# Altium footprint library 04.连接器件.pcb.PCBLIB: 363 footprints (part 4 of 23)
Each footprint in its own frame and in the unit in brackets; x right, y up, seen from the top. Pads: shape width x height; smd on the part's side, far side on the other; paste and mask are expansions set on the pad; w line width, h text height; cw(c..) or ccw(c..) is an arc to the next point about the centre after c.
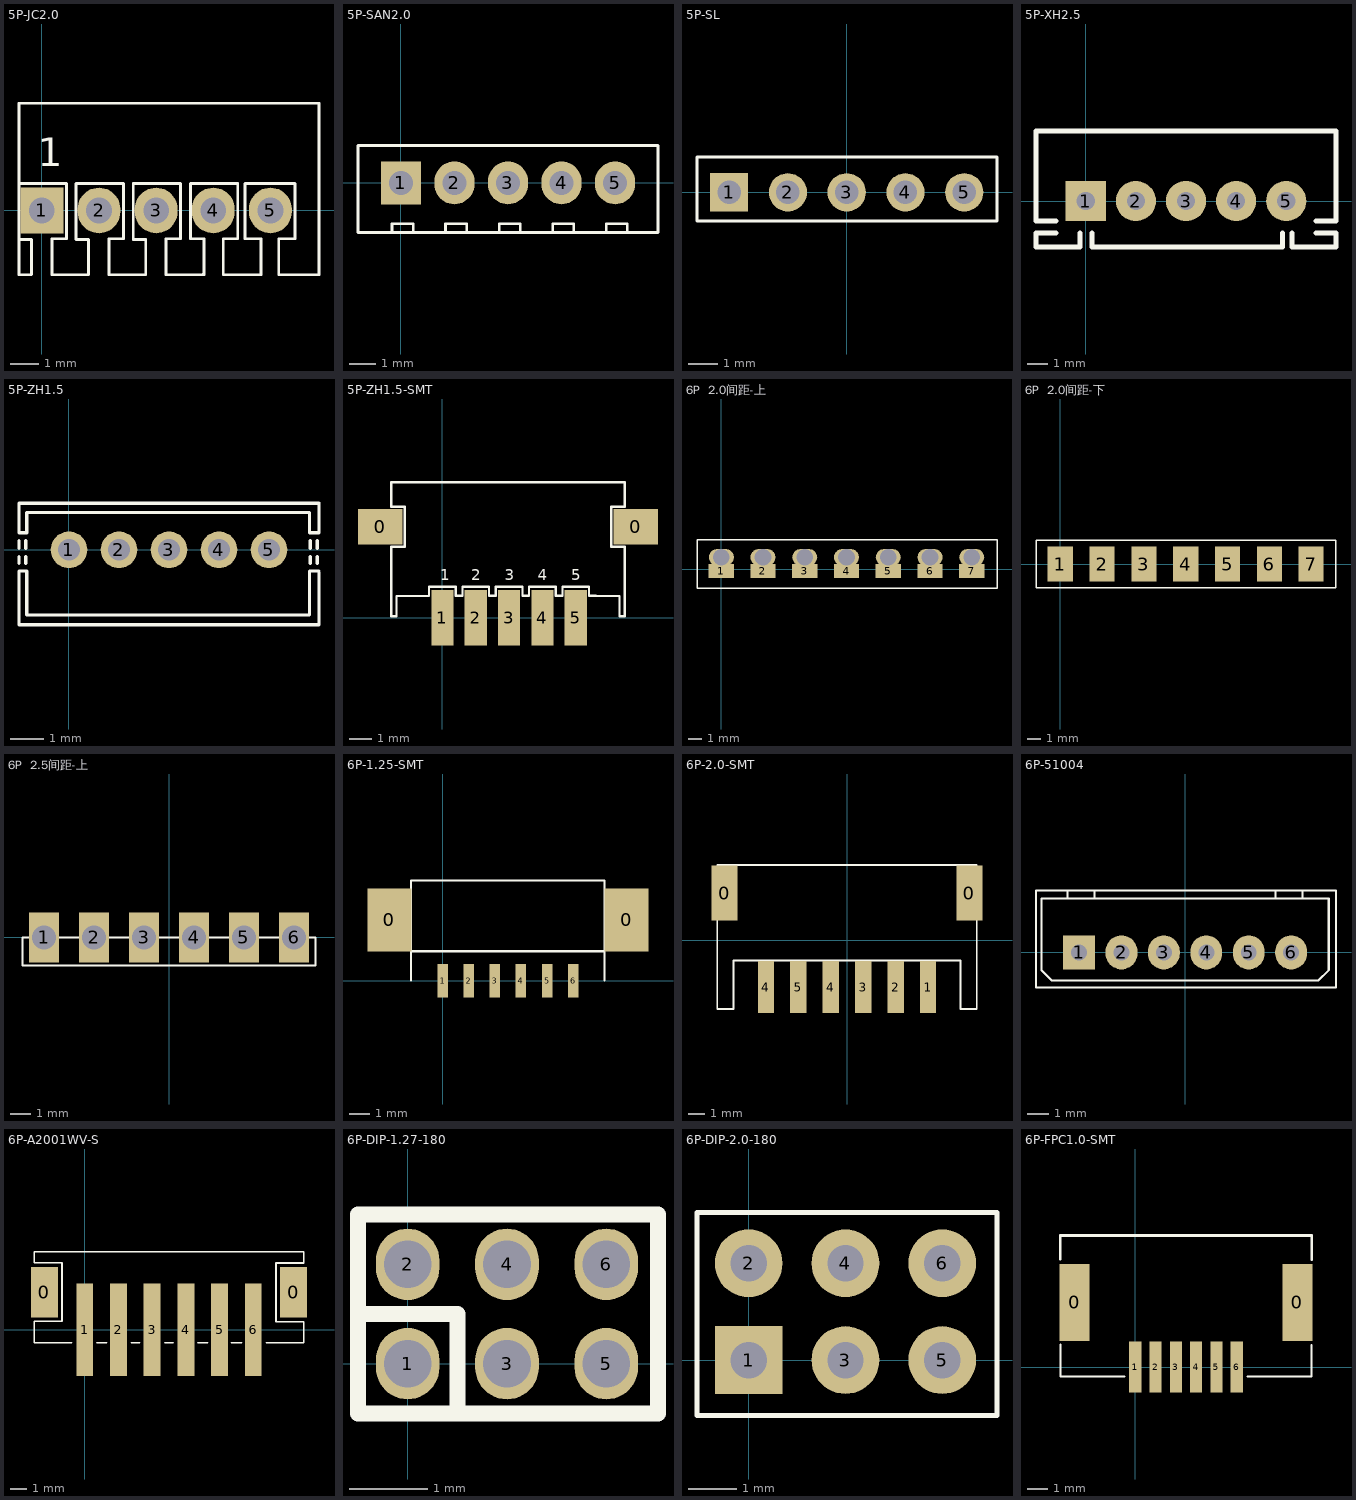
[diagram p3: the footprints below, top view; thin cyan lines are the x and y axes]

## 5P-JC2.0 [mm]
pads (5):
  rect 1.5x1.6 hole 0.9: 1(0,0)
  oval 1.5x1.6 hole 0.9: 2(2,0) 3(4,0) 4(6,0) 5(8,0)
TopOverlay:
  lines w0.1: 5.2,-2.25 5.623,-2.25 5.638,-2.235 ; 8.289,-1.005 8.289,-2.25 9.7,-2.25 9.7,3.75 -0.8,3.75 -0.8,0.94 ; 8.305,-0.991 8.864,-0.991 8.864,0.94 7.111,0.94 7.111,-0.991 7.67,-0.991 7.67,-2.25 6.349,-2.25 6.349,-0.991 6.857,-0.991 6.857,0.94 5.2,0.94 5.2,-0.991 5.67,-0.991 5.67,-2.25 4.349,-2.25 4.349,-0.991 4.857,-0.991 4.857,0.94 3.2,0.94 3.2,-1.016 3.638,-1.016 3.638,-2.235 3.623,-2.25 2.349,-2.25 2.349,-0.991 2.857,-0.991 2.857,0.94 1.2,0.94 1.2,-1.016 1.638,-1.016 1.638,-2.235 1.623,-2.25 1.2,-2.25 0.349,-2.25 0.349,-0.991 0.857,-0.991 0.857,0.94 -0.8,0.94 ; -0.8,-1.016 -0.362,-1.016 -0.362,-2.235 -0.377,-2.25 -0.8,-2.25 -0.8,-1.016 ; -0.8,-1.016 -0.8,0.94
  text "1" at -0.152,1.549 h1
3D body "5P-JC2.0.STEP": height 3.4, standoff -3.22, extent -1.237,-7.19 9.263,3.81

## 5P-SAN2.0 [mm]
pads (5):
  rect 1.5x1.6 hole 0.9: 1(0,0)
  oval 1.5x1.6 hole 0.9: 2(2,0) 3(4,0) 4(6,0) 5(8,0)
TopOverlay:
  lines w0.1: -1.6,-1.85 -1.6,1.4 9.601,1.4 ; -1.575,-1.854 9.601,-1.854 9.601,1.397 ; -0.33,-1.85 -0.33,-1.524 0.457,-1.524 0.457,-1.85 ; 1.67,-1.85 1.67,-1.524 2.457,-1.524 2.457,-1.85 ; 3.67,-1.85 3.67,-1.524 4.457,-1.524 4.457,-1.85 ; 5.67,-1.85 5.67,-1.524 6.457,-1.524 6.457,-1.85 ; 7.67,-1.85 7.67,-1.524 8.457,-1.524 8.457,-1.85 ; 9.592,-1.85 9.6,-1.842
3D body "5P-SAN2.0.STEP": height 11, standoff -3.19, extent -1.6,-1.854 9.6,1.396

## 5P-SL [mm]
pads (5):
  rect 1.3x1.3 hole 0.8: 1(-4,0)
  round 1.3 hole 0.8: 2(-2,0) 3(0,0) 4(2,0) 5(4,0)
TopOverlay:
  lines w0.1: -5.094,-0.971 -4.928,-0.971 1.354,-0.971 5.115,-0.971 5.115,1.197 -5.094,1.197 -5.094,-0.153 -5.094,-0.971

## 5P-XH2.5 [mm]
pads (5):
  rect 2x2 hole 0.9: 1(0,0)
  round 2 hole 0.9: 2(2.5,0) 3(5,0) 4(7.5,0) 5(10,0)
TopOverlay:
  lines w0.254: -1.48,-1.6 -2.48,-1.6 -2.48,-2.3 -0.58,-2.3 ; -1.48,-1 -2.48,-1 -2.48,3.5 10.12,3.5 12.421,3.5 ; -0.88,-2.3 -0.28,-2.3 -0.28,-1.6 ; 0.32,-1.6 0.32,-2.3 0.62,-2.3 3.82,-2.3 7.02,-2.3 9.32,-2.3 ; 9.22,-2.3 9.82,-2.3 9.82,-1.6 ; 10.28,-1.6 10.28,-2.3 10.88,-2.3 ; 10.58,-2.3 12.48,-2.3 12.48,-1.6 11.48,-1.6 ; 11.48,-1 12.48,-1 12.48,3.5
3D body "5PIN-XH2.5.STEP": height 5.9, standoff -3.47, extent -2.515,-2.337 12.385,3.413

## 5P-ZH1.5 [mm]
pads (5):
  round 1.1 hole 0.65: 1(0,0) 2(1.5,0) 3(3,0) 4(4.5,0) 5(6,0)
TopOverlay:
  lines w0.1: -1.499,-0.406 -1.499,-0.203 ; -1.499,0.051 -1.499,0.279 ; -1.295,-0.406 -1.295,-0.203 ; -1.295,0.051 -1.295,0.279 ; 7.242,-0.406 7.242,-0.203 ; 7.242,0.051 7.242,0.279 ; 7.445,-0.406 7.445,-0.203 ; 7.445,0.051 7.445,0.279 ; 7.493,-2.25 -1.5,-2.25 -1.5,-0.635 -1.27,-0.635 -1.27,-1.956 7.216,-1.956 7.216,-0.635 7.5,-0.635 ; 7.5,-2.25 7.5,-0.682 ; -1.5,0.508 -1.27,0.508 -1.27,1.118 7.216,1.118 7.216,0.508 7.5,0.508 7.5,1.391 7.491,1.4 -1.5,1.4 -1.5,0.508
3D body "5P-ZH1.5.STEP": height 4.6, standoff -2.45, extent -1.499,-2.261 7.501,1.389

## 5P-ZH1.5-SMT [mm]
pads (7):
  rect 2x1.6 smd: 0(-2.8,4.1) 0(8.7,4.1)
  rect 1x2.5 smd: 1(0,0) 2(1.5,0) 3(3,0) 4(4.5,0) 5(6,0)
TopOverlay:
  lines w0.1: 6.9,1 6.6,1 ; 5.1,1 5.4,1 ; 5.1,1 5.1,1.4 ; 5.1,1 5.4,1 ; 5.1,1 5.1,1.4 ; 5.1,1.4 3.9,1.4 3.9,1 3.6,1 3.6,1.4 2.4,1.4 2.4,1 2.1,1 2.1,1.4 0.9,1.4 0.9,1 0.6,1 0.6,1.4 -0.6,1.4 -0.6,1 -0.61,0.99 -2.07,0.99 -2.07,0.07 -2.3,0.07 -2.3,3.2 -1.7,3.2 -1.7,5 -2.3,5 -2.3,6.1 8.2,6.1 8.2,5 7.6,5 7.6,3.2 8.2,3.2 8.2,0.07 7.97,0.07 7.97,0.99 6.61,0.99 ; 5.4,1 5.4,1.4 ; 5.4,1 5.4,1.4 ; 5.4,1 5.4,1.4 ; 5.4,1.4 6.6,1.4 ; 5.4,1.4 6.6,1.4 ; 5.4,1.4 6.6,1.4 ; 6.6,1 6.61,0.99 ; 6.6,1 6.6,1.4 ; 6.6,1 6.61,0.99 ; 6.6,1 6.6,1.4 ; 6.6,1 6.6,1.4
  text "5" at 5.8,1.7 h0.5
  text "4" at 4.3,1.7 h0.5
  text "3" at 2.8,1.7 h0.5
  text "2" at 1.3,1.7 h0.5
  text "1" at -0.1,1.7 h0.5
3D body "5P-ZH1.5-SMT.STEP": height 3.7, standoff -0.25, extent -2.337,-0.381 8.163,6.119

## 6P  2.0间距-上 [mm]
pads (14):
  rect 1.8x1 / inner rect 1.8x2 / far side rect 1.8x2 all layers, no hole: 1(-0.012,-0.127) 2(2.988,-0.127) 3(5.988,-0.127) 4(8.988,-0.127) 5(11.988,-0.127) 6(14.988,-0.127) 7(17.988,-0.127)
  oval 1.8x1.2 hole 1.2: ""(0,0.863) ""(2.988,0.863) ""(5.988,0.863) ""(8.988,0.863) ""(11.988,0.863) ""(14.988,0.863) ""(17.988,0.863)
TopOverlay:
  lines w0.1: -1.752,-1.354 -1.752,2.123 19.8,2.123 19.8,-1.354 -1.752,-1.354

## 6P  2.0间距-下 [mm]
pads (7):
  rect 1.8x2.5 smd: 1(0,0) 2(3,0) 3(6,0) 4(9,0) 5(12,0) 6(15,0) 7(18,0)
TopOverlay:
  lines w0.1: -1.74,-1.701 19.78,-1.701 19.78,1.707 -1.74,1.707 -1.74,-1.701

## 6P  2.5间距-上 [mm]
pads (6):
  rect 1.5x2.5 hole 1.2: 1(-6.25,0) 2(-3.75,0) 3(-1.25,0) 4(1.25,0) 5(3.75,0) 6(6.25,0)
TopOverlay:
  lines w0.1: -7.32,-1.403 7.319,-1.403 7.319,0 -7.32,0 -7.32,-1.403

## 6P-1.25-SMT [mm]
pads (8):
  rect 2.1x3 smd: 0(-2.54,2.896) 0(8.799,2.896)
  rect 0.5x1.6 smd: 1(0,0) 2(1.25,0) 3(2.5,0) 4(3.75,0) 5(5,0) 6(6.25,0)
TopOverlay:
  lines w0.1: -1.5,0 -1.5,4.445 -1.5,4.774 5.232,4.774 7.75,4.774 7.75,0 ; -1.5,1.4 0,1.4 5.25,1.4 7.75,1.4
3D body: height 3.7, standoff 0, extent -3.607,1.397 9.855,4.826
3D body: height 0.3, standoff 0, extent -0.356,-0.889 0.356,1.324
3D body: height 0.3, standoff 0, extent 0.889,-0.889 1.6,1.324
3D body: height 0.3, standoff 0, extent 2.134,-0.889 2.845,1.324
3D body: height 0.3, standoff 0, extent 3.404,-0.889 4.115,1.324
3D body: height 0.3, standoff 0, extent 4.648,-0.889 5.359,1.324
3D body: height 0.3, standoff 0, extent 5.893,-0.889 6.604,1.324

## 6P-2.0-SMT [mm]
pads (8):
  rect 1.6x3.4 smd: 0(-7.55,2.9) 0(7.55,2.9)
  rect 1x3.2 smd: 1(5,-2.9) 2(3,-2.9) 3(1,-2.9) 4(-5,-2.9) 4(-1,-2.9) 5(-3,-2.9)
TopOverlay:
  lines w0.1: 1.07,4.628 8,4.628 8,-4.25 7,-4.25 7,-1.265 3.75,-1.265 ; 3.781,-1.265 -7,-1.265 -7,-4.25 -8,-4.25 -8,4.628 6.93,4.628
3D body: height 0.3, standoff 0, extent -3.5,-3.713 -2.5,-0.55
3D body: height 0.3, standoff 0, extent -5.5,-3.713 -4.5,-0.55
3D body: height 0.3, standoff 0, extent 0.5,-3.713 1.5,-0.55
3D body: height 5.6, standoff 0, extent -8,-1.275 8,4.628
3D body: height 0.3, standoff 0, extent 2.5,-3.713 3.5,-0.55
3D body: height 0.3, standoff 0, extent 4.5,-3.713 5.5,-0.55
3D body: height 3.2, standoff 0, extent -8,-3.221 -7.3,-0.958
3D body: height 3.2, standoff 0, extent 7.25,-3.239 8,-0.976
3D body: height 0.3, standoff 0, extent -1.5,-3.713 -0.5,-0.55

## 6P-51004 [mm]
pads (6):
  rect 1.5x1.6 hole 0.75: 1(-5,0)
  oval 1.5x1.6 hole 0.75: 2(-3,0) 3(-1,0) 4(1,0) 5(3,0) 6(5,0)
TopOverlay:
  lines w0.1: -5.54,2.54 -5.54,2.921 ; -4.27,2.54 -4.27,2.921 ; 4.27,2.54 4.27,2.921 ; 5.54,2.54 5.54,2.921 ; -7.032,-1.651 -7.032,2.921 7.115,2.921 7.115,-1.651 -7.032,-1.651 ; -6.774,-0.833 -6.774,2.54 0.774,2.54 6.774,2.54 6.774,-0.833 6.282,-1.325 2,-1.325 -6.282,-1.325 -6.774,-0.833
3D body "510004-6.STEP": height 5.9, standoff -3.47, extent -6.949,-1.555 7.051,2.845

## 6P-A2001WV-S [mm]
pads (8):
  rect 1.6x3 smd: 0(-2.4,2.235) 0(12.4,2.235)
  rect 1x5.5 smd: 1(0,0) 2(2,0) 3(4,0) 4(6,0) 5(8,0) 6(10,0)
TopOverlay:
  lines w0.1: -3.001,4.631 -3.001,3.988 -1.35,3.988 -1.35,0.508 -3,0.508 -3,-0.769 -0.766,-0.769 ; -3,4.631 13,4.631 13,3.962 11.35,3.962 11.35,0.483 13,0.483 13,-0.769 10.766,-0.769 ; 0.707,-0.769 1.292,-0.769 ; 2.765,-0.769 3.273,-0.769 ; 4.746,-0.769 5.254,-0.769 ; 6.702,-0.769 7.286,-0.769 ; 8.708,-0.769 9.318,-0.769
3D body "A2001WV-6.STEP": height 5.9, standoff -0.25, extent -3.025,-2.765 12.975,4.665

## 6P-DIP-1.27-180 [mil]
pads (6):
  oval 32x36 hole 24: 1(0,0) 2(0,50) 3(50,0) 4(50,50) 5(100,0) 6(100,50)
TopOverlay:
  lines w8: -25,25 25,25 25,-25 ; -25,-25 -25,75 126,75 126,-25 -25,-25

## 6P-DIP-2.0-180 [mm] "插针"
pads (6):
  rect 1.4x1.4 hole 0.75: 1(0,0)
  round 1.4 hole 0.75: 2(0,2) 3(2,0) 4(2,2) 5(4,0) 6(4,2)
TopOverlay:
  lines w0.1: -1.067,-1.143 5.131,-1.143 5.131,3.048 -1.067,3.048 -1.067,-1.143
3D body "DIP6(2.0)排针.": height 8, standoff -2.6, extent -0.965,-1.041 5.035,2.959

## 6P-FPC1.0-SMT [mm] "FPC.SMT(1.0G-WTS-6P)"
height 2.7
pads (8):
  rect 1.47x3.8 smd: 0(-2.985,3.186) 0(7.985,3.186)
  rect 0.6x2.5 smd: 1(0,0) 2(1,0) 3(2,0) 4(3,0) 5(4,0) 6(5,0)
TopOverlay:
  lines w0.1: -3.687,1.103 -3.687,-0.457 -0.537,-0.457 ; 5.533,-0.457 8.683,-0.457 8.683,1.092
  lines w0.127: -3.687,5.319 -3.687,6.481 8.683,6.481 8.683,5.283
3D body "FPC.SMT(1.0G-WTS-6P).STEP": height 2.7, standoff 0, extent -3.731,-0.508 8.709,6.532